# Altium integrated library Altium_PCB_Connector.IntLib: 293 symbols (part 3 of 3)
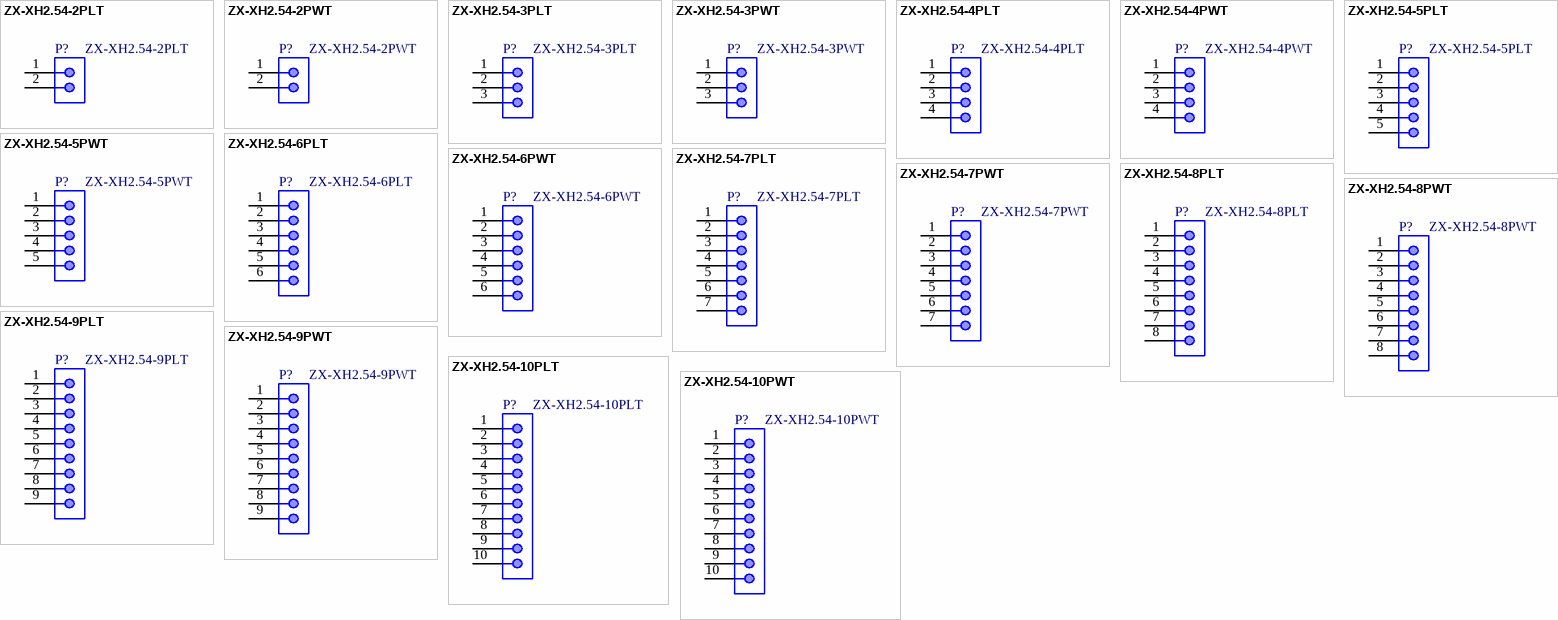
[diagram p14: symbols ZX-XH2.54-2PLT to ZX-XH2.54-10PWT]

## ZX-XH2.54-8PWT
designator P?
1x8P 8P XH 1 2.54mm Tin 8 -25℃~+85℃ Brass 3A Horizontal attachment SMD,P=2.54mm,Surface Mount，Right Angle Wire To Board Connector ROHS; Manufacturer: Megastar; Pin Number: 8; Contact Resistance: 20mOhm; Gender: Male; Withstanding Voltage: 1000VAC; Working Voltage: 250VAC; ComponentLink1Description: Datasheet; ComponentLink1URL: https://www.lcsc.com/datasheet/lcsc_datasheet_2306191414_Megastar-ZX-XH2-54-2PWT_C7429671.pdf; Pitch: 2.54mm; Packaging: SMD,P=2.54mm,Surface Mount，Right Angle; Type: Right Angled Bottom Locking; Rated Current: 3A; Supplier 1 URL: N/A; Supplier 2 URL: N/A; Supplier 3 URL: N/A; Value: ZX-XH2.54-8PWT; LCSC Part #: C7429677; Manufacturer Part Number: ZX-XH2.54-8PWT; Mount: SMD; Operating Temperature Max: + 85 C; Operating Temperature Min: - 25 C; Package / Case: 8; Supplier 1: Mouser; Supplier 1 Part Number: N/A; Supplier 2: Digi-Key; Supplier 2 Part Number: N/A; Supplier 3: thegioiic; Supplier 3 Part Number: N/A
footprint ZX-XH2.54-8PWT (2.54mm Male Left Angled Header Bottom Locking, 8p, SMD)
pins: 1, 2, 3, 4, 5, 6, 7, 8

## ZX-XH2.54-9PLT
designator P?
1x9P 9P XH 1 2.54mm Tin 9 -25℃~+85℃ Brass 3A Standing paste SMD,P=2.54mm Wire To Board Connector ROHS; Manufacturer: Megastar; Pin Number: 9; Contact Resistance: 20mOhm; Gender: Male; Withstanding Voltage: 1000VAC; Working Voltage: 250VAC; ComponentLink1Description: Datasheet; ComponentLink1URL: https://www.lcsc.com/datasheet/lcsc_datasheet_2306191415_Megastar-ZX-XH2-54-10PLT_C7429688.pdf; Pitch: 2.54mm; Packaging: SMD,P=2.54mm; Type: Standing paste; Rated Current: 3A; Supplier 1 URL: N/A; Supplier 2 URL: N/A; Supplier 3 URL: N/A; Value: ZX-XH2.54-9PLT; LCSC Part #: C7429687; Manufacturer Part Number: ZX-XH2.54-9PLT; Mount: SMD; Operating Temperature Max: + 85 C; Operating Temperature Min: - 25 C; Package / Case: 9; Supplier 1: Mouser; Supplier 1 Part Number: N/A; Supplier 2: Digi-Key; Supplier 2 Part Number: N/A; Supplier 3: thegioiic; Supplier 3 Part Number: N/A
footprint ZX-XH2.54-9PLT
pins: 1, 2, 3, 4, 5, 6, 7, 8, 9

## ZX-XH2.54-9PWT
designator P?
1x9P 9P XH 1 2.54mm Tin 9 -25℃~+85℃ Brass 3A Horizontal attachment SMD,P=2.54mm,Surface Mount，Right Angle Wire To Board Connector ROHS; Manufacturer: Megastar; Pin Number: 9; Contact Resistance: 20mOhm; Gender: Male; Withstanding Voltage: 1000VAC; Working Voltage: 250VAC; ComponentLink1Description: Datasheet; ComponentLink1URL: https://www.lcsc.com/datasheet/lcsc_datasheet_2306191414_Megastar-ZX-XH2-54-2PWT_C7429671.pdf; Pitch: 2.54mm; Packaging: SMD,P=2.54mm,Surface Mount，Right Angle; Type: Right Angled Bottom Locking; Rated Current: 3A; Supplier 1 URL: N/A; Supplier 2 URL: N/A; Supplier 3 URL: N/A; Value: ZX-XH2.54-9PWT; LCSC Part #: C7429678; Manufacturer Part Number: ZX-XH2.54-9PWT; Mount: SMD; Operating Temperature Max: + 85 C; Operating Temperature Min: - 25 C; Package / Case: 9; Supplier 1: Mouser; Supplier 1 Part Number: N/A; Supplier 2: Digi-Key; Supplier 2 Part Number: N/A; Supplier 3: thegioiic; Supplier 3 Part Number: N/A
footprint ZX-XH2.54-9PWT (2.54mm Male Left Angled Header Bottom Locking, 9p, SMD)
pins: 1, 2, 3, 4, 5, 6, 7, 8, 9

## ZX-XH2.54-10PLT
designator P?
1x10P 10P XH 1 2.54mm Tin 10 -25℃~+85℃ Brass 3A Standing paste SMD,P=2.54mm Wire To Board Connector ROHS; Manufacturer: Megastar; Pin Number: 10; Contact Resistance: 20mOhm; Gender: Male; Withstanding Voltage: 1000VAC; Working Voltage: 250VAC; ComponentLink1Description: Datasheet; ComponentLink1URL: https://www.lcsc.com/datasheet/lcsc_datasheet_2306191415_Megastar-ZX-XH2-54-10PLT_C7429688.pdf; Pitch: 2.54mm; Packaging: SMD,P=2.54mm; Type: Standing paste; Rated Current: 3A; Supplier 1 URL: N/A; Supplier 2 URL: N/A; Supplier 3 URL: N/A; Value: ZX-XH2.54-10PLT; LCSC Part #: C7429688; Manufacturer Part Number: ZX-XH2.54-10PLT; Mount: SMD; Operating Temperature Max: + 85 C; Operating Temperature Min: - 25 C; Package / Case: 10; Supplier 1: Mouser; Supplier 1 Part Number: N/A; Supplier 2: Digi-Key; Supplier 2 Part Number: N/A; Supplier 3: thegioiic; Supplier 3 Part Number: N/A
footprint ZX-XH2.54-10PLT
pins: 1, 2, 3, 4, 5, 6, 7, 8, 9, 10

## ZX-XH2.54-10PWT
designator P?
1x10P 10P XH 1 2.54mm Tin 10 -25℃~+85℃ Brass 3A Horizontal attachment SMD,P=2.54mm,Surface Mount，Right Angle Wire To Board Connector ROHS; Manufacturer: Megastar; Pin Number: 10; Contact Resistance: 20mOhm; Gender: Male; Withstanding Voltage: 1000VAC; Working Voltage: 250VAC; ComponentLink1Description: Datasheet; ComponentLink1URL: https://www.lcsc.com/datasheet/lcsc_datasheet_2306191414_Megastar-ZX-XH2-54-2PWT_C7429671.pdf; Pitch: 2.54mm; Packaging: SMD,P=2.54mm,Surface Mount，Right Angle; Type: Right Angled Bottom Locking; Rated Current: 3A; Supplier 1 URL: N/A; Supplier 2 URL: N/A; Supplier 3 URL: N/A; Value: ZX-XH2.54-10PWT; LCSC Part #: C7429679; Manufacturer Part Number: ZX-XH2.54-10PWT; Mount: SMD; Operating Temperature Max: + 85 C; Operating Temperature Min: - 25 C; Package / Case: 10; Supplier 1: Mouser; Supplier 1 Part Number: N/A; Supplier 2: Digi-Key; Supplier 2 Part Number: N/A; Supplier 3: thegioiic; Supplier 3 Part Number: N/A
footprint ZX-XH2.54-10PWT (2.54mm Male Left Angled Header Bottom Locking, 10p, SMD)
pins: 1, 2, 3, 4, 5, 6, 7, 8, 9, 10